# Altium footprint library Elements_LT.PcbLib: 145 footprints (part 2 of 10)
Each footprint in its own frame and in the unit in brackets; x right, y up, seen from the top. Pads: shape width x height; smd on the part's side, far side on the other; paste and mask are expansions set on the pad; w line width, h text height; cw(c..) or ccw(c..) is an arc to the next point about the centre after c.
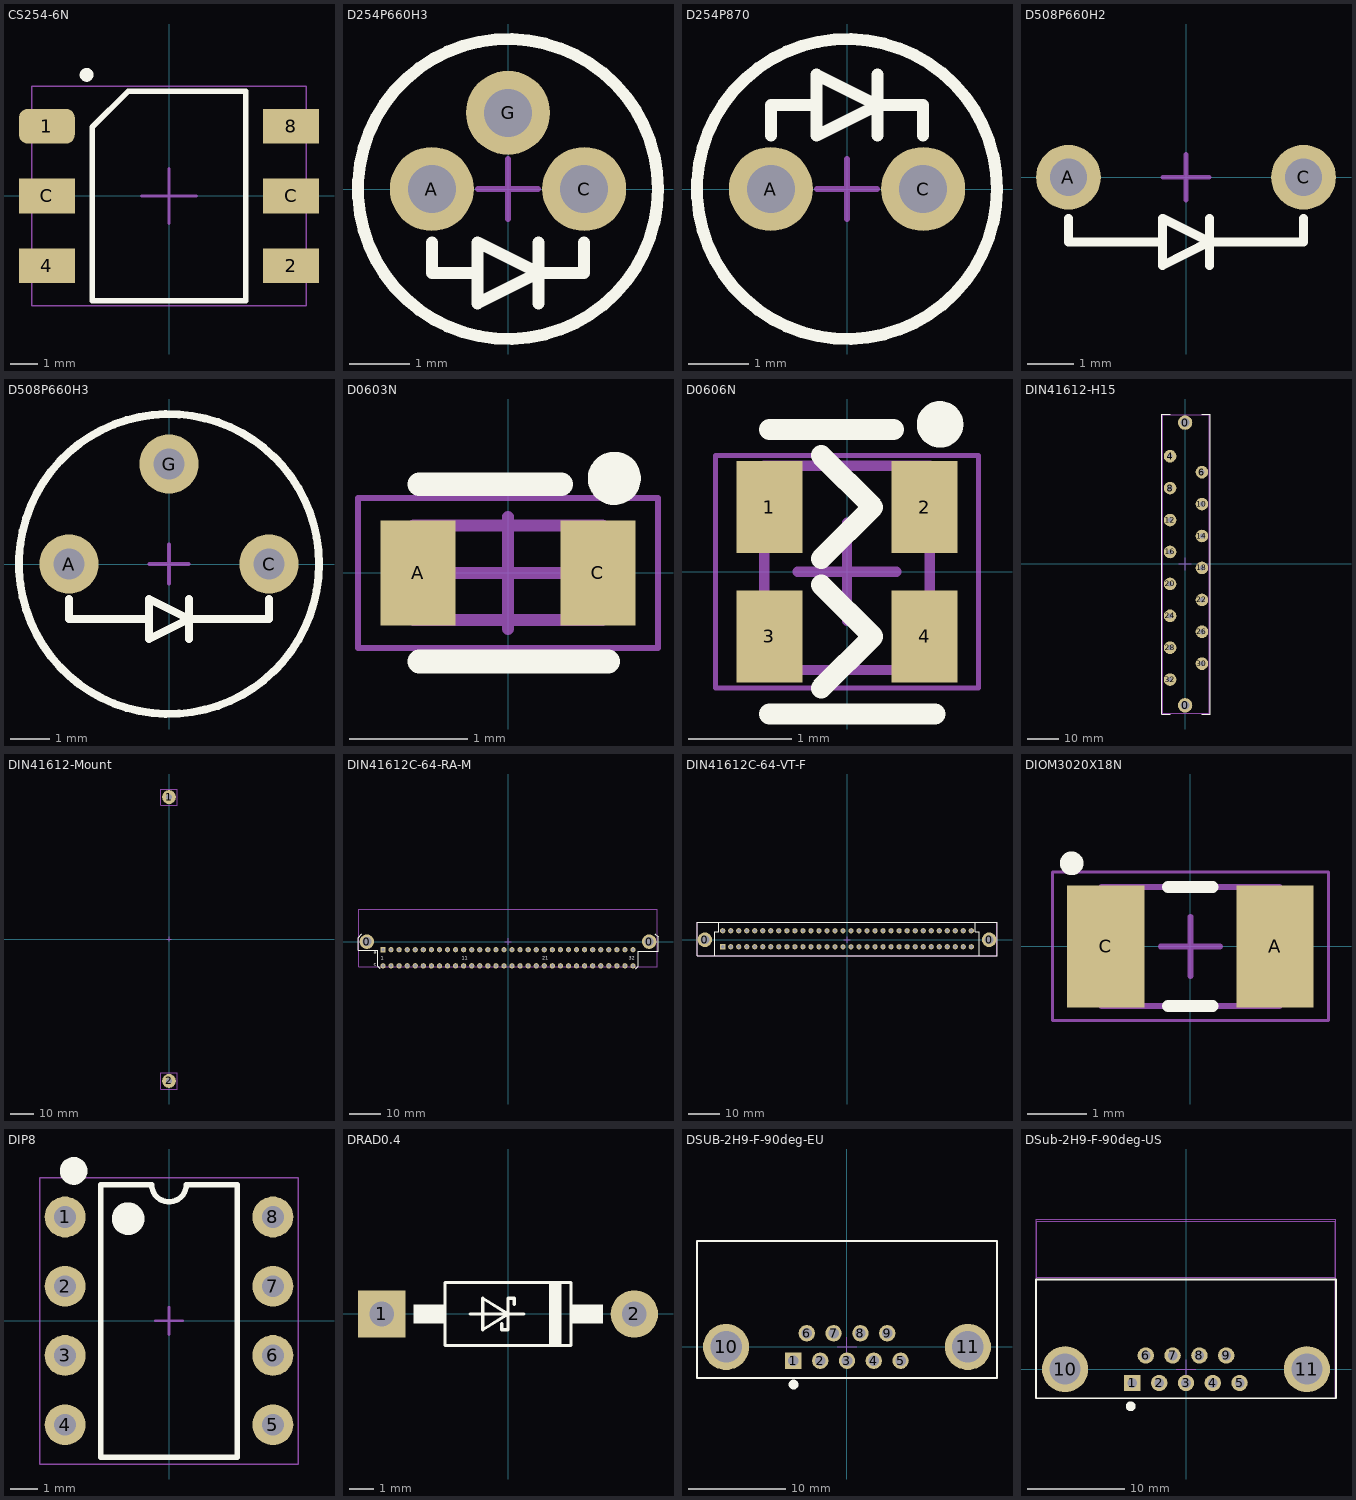
[diagram p1: the footprints below, top view; thin cyan lines are the x and y axes]

## CS254-6N [mil] "Code Switch, 4 Bits, 6 Pins, SMD"
pads (6):
  rrect50% 80x50 smd: 1(-175,100)
  rect 80x50 smd: 2(175,-100) 4(-175,-100) 8(175,100) C(-175,0) C(175,0)
Top Overlay:
  circle w11.81: c-118.11,173.54 r3.94
  lines w7.87: -110,-150 110,-150 110,150 -58.66,150 -110,98.66 -110,-150
Mechanical 15:
  lines w1.97: -196.85,-157.48 196.85,-157.48 196.85,157.48 -196.85,157.48 -196.85,-157.48
  lines w3.94: -39.37,0 39.37,0 ; 0,-39.37 0,39.37
3D body: height 169.29, standoff 0, extent -157.48,-157.48 157.48,157.48

## D254P660H3 [mm] "Diode, Single, 3 Pins, Pitch 2.54mm"
height 6.6
pads (3):
  round 1.4 hole 0.8: A(-1.27,0) C(1.27,0) G(0,1.27)
Top Overlay:
  circle w0.2: c0,0 r2.5
  lines w0.2: -1.27,-0.889 -1.27,-1.397 -0.508,-1.397 ; 0.508,-1.905 0.508,-0.889 ; 1.27,-0.889 1.27,-1.397 0.508,-1.397 ; 0.508,-1.397 -0.508,-1.905 -0.508,-0.889 0.508,-1.397
Top Solder:
  circle w0.305: c1.27,-1.27 r0.127
Mechanical 15:
  lines w0.1: -0.5,0 0.5,0 ; 0,-0.5 0,0.5

## D254P870 [mm] "Diode, Single, Pitch 2.54mm"
height 8.7
pads (2):
  round 1.4 hole 0.8: A(-1.27,0) C(1.27,0)
Top Overlay:
  circle w0.2: c0,0 r2.5
  lines w0.2: -1.27,0.889 -1.27,1.397 -0.508,1.397 ; 0.508,0.889 0.508,1.905 ; 1.27,0.889 1.27,1.397 0.508,1.397 ; 0.508,1.397 -0.508,0.889 -0.508,1.905 0.508,1.397
Top Solder:
  circle w0.305: c1.27,-1.27 r0.127
Mechanical 15:
  lines w0.1: -0.5,0 0.5,0 ; 0,-0.5 0,0.5

## D508P660H2 [mm] "Diode, Single, 2 Pins, Pitch 5.08mm"
height 6.6
pads (2):
  round 1.4 hole 0.8: A(-2.54,0) C(2.54,0)
Top Overlay:
  lines w0.2: -2.54,-0.889 -2.54,-1.397 -0.508,-1.397 ; 0.508,-1.905 0.508,-0.889 ; 2.54,-0.889 2.54,-1.397 0.508,-1.397 ; 0.508,-1.397 -0.508,-0.889 -0.508,-1.905 0.508,-1.397
Top Solder:
  circle w0.305: c2.54,1.27 r0.127
Mechanical 15:
  lines w0.1: -0.5,0 0.5,0 ; 0,-0.5 0,0.5

## D508P660H3 [mm] "Diode, Single, 3 Pins, Pitch 5.08mm"
height 6.6
pads (3):
  round 1.5 hole 0.8: A(-2.54,0) C(2.54,0) G(0,2.54)
Top Overlay:
  circle w0.2: c0,0 r3.81
  lines w0.2: -2.54,-0.889 -2.54,-1.397 -0.508,-1.397 ; 0.508,-1.905 0.508,-0.889 ; 2.54,-0.889 2.54,-1.397 0.508,-1.397 ; 0.508,-1.397 -0.508,-1.905 -0.508,-0.889 0.508,-1.397
Top Solder:
  circle w0.305: c2.54,1.27 r0.127
Mechanical 15:
  lines w0.1: -0.5,0 0.5,0 ; 0,-0.5 0,0.5

## D0603N [mil] "LED, SMD, 0603 / 1608"
height 39.37
pads (2):
  rect 25x35 smd: A(-30,0) C(30,0)
Top Overlay:
  circle w9.84: c35.43,31.5 r3.94
  lines w7.87: -29.53,-29.53 33.46,-29.53 ; -29.53,29.53 17.72,29.53
Mechanical 13:
  lines w3.94: -31.49,-15.75 -31.49,15.75 31.5,15.75 31.5,-15.75 -31.49,-15.75
Mechanical 15:
  lines w1.97: -50,-25 -50,25 50,25 50,-25 -50,-25
  lines w3.94: -18.7,0 18.7,0 ; 0,-18.7 0,18.7
3D body: height 29.53, standoff 7.87, extent -19.68,-15.75 19.69,15.75
3D body: height 7.87, standoff 0, extent -31.5,-15.75 31.5,15.75

## D0606N [mm] "LED, BiColor, SMD, 0606 / 1616"
height 1
pads (4):
  rect 0.635x0.889 smd: 1(-0.75,0.625) 2(0.75,0.625) 3(-0.75,-0.625) 4(0.75,-0.625)
Top Overlay:
  circle w0.25: c0.9,1.425 r0.1
  lines w0.2: -0.75,-1.375 0.85,-1.375 ; -0.75,1.375 0.45,1.375 ; -0.25,-1.125 0.25,-0.625 -0.25,-0.125 ; -0.25,0.125 0.25,0.625 -0.25,1.125
Mechanical 13:
  lines w0.1: -0.8,-0.95 0.8,-0.95 0.8,1.025 -0.8,1.025 -0.8,-0.95
Mechanical 15:
  lines w0.05: -1.27,-1.125 1.27,-1.125 1.27,1.125 -1.27,1.125 -1.27,-1.125
  lines w0.1: -0.475,0 0.475,0 ; 0,-0.475 0,0.475
3D body: height 0.2, standoff 0, extent -0.8,-1.025 0.8,1.025
3D body: height 0.75, standoff 0.2, extent -0.7,0 0.7,0.975
3D body: height 0.75, standoff 0.2, extent -0.7,-0.975 0.7,0

## DIN41612-H15 [mm] "DIN41612 Power Connector H15"
height 10
pads (17):
  round 4.6 hole 2.8: 0(0,-45) 0(0,45)
  round 4 hole 1.6: 4(-4.78,34.29) 6(5.38,29.21) 8(-4.78,24.13) 10(5.38,19.05) 12(-4.78,13.97) 14(5.38,8.89) 16(-4.78,3.81) 18(5.38,-1.27) 20(-4.78,-6.35) 22(5.38,-11.43) 24(-4.78,-16.51) 26(5.38,-21.59) 28(-4.78,-26.67) 30(5.38,-31.75) 32(-4.78,-36.83)
Top Overlay:
  lines w0.2: -4.7,-47.77 -7.45,-47.77 -7.45,47.73 -4.7,47.73 ; 5.3,-47.77 8.05,-47.77 8.05,47.73 5.3,47.73
Mechanical 13:
  lines w0.1: -7.1,-47.5 7.7,-47.5 7.7,47.5 -7.1,47.5 -7.1,-47.5
Mechanical 15:
  lines w0.05: -7.2,-47.52 7.8,-47.52 7.8,47.48 -7.2,47.48 -7.2,-47.52
  lines w0.1: -2,0 2,0 ; 0,-2 0,2
3D body "41612-h15.stp": height 10, standoff -4.3, extent -7.1,-47.5 7.7,47.5

## DIN41612-Mount [mm] "Back Plane Case Mounting Pad"
pads (2):
  round 6 hole 2.7: 1(0,61.25) 2(0,-61.25)
Mechanical 15:
  lines w0.05: -3.5,-64.75 -3.5,-57.75 3.5,-57.75 3.5,-64.75 -3.5,-64.75 ; -3.5,57.75 -3.5,64.75 3.5,64.75 3.5,57.75 -3.5,57.75
  lines w0.1: -1,0 1,0 ; 0,-1 0,1

## DIN41612C-64-RA-M [mm] "Connector; DIN 41612, Type C, Thru-Hole; Rows a+c, 64 Position; Right Angle"
height 11.1
pads (66):
  round 4.6 hole 2.8: 0(-44.45,0) 0(44.45,0)
  rect 1.65x1.65 hole 1: A1(-39.37,-2.54)
  round 1.65 hole 1: A2(-36.83,-2.54) A3(-34.29,-2.54) A4(-31.75,-2.54) A5(-29.21,-2.54) A6(-26.67,-2.54) A7(-24.13,-2.54) A8(-21.59,-2.54) A9(-19.05,-2.54) A10(-16.51,-2.54) A11(-13.97,-2.54) A12(-11.43,-2.54) A13(-8.89,-2.54) A14(-6.35,-2.54) A15(-3.81,-2.54) A16(-1.27,-2.54) A17(1.27,-2.54) A18(3.81,-2.54) A19(6.35,-2.54) A20(8.89,-2.54) A21(11.43,-2.54) A22(13.97,-2.54) A23(16.51,-2.54) A24(19.05,-2.54) A25(21.59,-2.54) A26(24.13,-2.54) A27(26.67,-2.54) A28(29.21,-2.54) A29(31.75,-2.54) A30(34.29,-2.54) A31(36.83,-2.54) A32(39.37,-2.54) C1(-39.37,-7.62) C2(-36.83,-7.62) C3(-34.29,-7.62) C4(-31.75,-7.62) C5(-29.21,-7.62) C6(-26.67,-7.62) C7(-24.13,-7.62) C8(-21.59,-7.62) C9(-19.05,-7.62) C10(-16.51,-7.62) C11(-13.97,-7.62) C12(-11.43,-7.62) C13(-8.89,-7.62) C14(-6.35,-7.62) C15(-3.81,-7.62) C16(-1.27,-7.62) C17(1.27,-7.62) C18(3.81,-7.62) C19(6.35,-7.62) C20(8.89,-7.62) C21(11.43,-7.62) C22(13.97,-7.62) C23(16.51,-7.62) C24(19.05,-7.62) C25(21.59,-7.62) C26(24.13,-7.62) C27(26.67,-7.62) C28(29.21,-7.62) C29(31.75,-7.62) C30(34.29,-7.62) C31(36.83,-7.62) C32(39.37,-7.62)
Top Overlay:
  lines w0.2: -46,2.5 -47.25,1.25 -47.25,-2.74 -42.125,-2.74 -41,-2.74 -41,-6.75 -41,-7.75 -40.375,-8.375 ; 40.25,-8.5 41,-7.75 41,-2.955 47.25,-2.955 47.25,1.5 46.25,2.5
  text "21" at 10.795,-6.13 h2
  text "11" at -14.605,-6.13 h2
  text "32" at 38.1,-6.13 h2
  text "c" at -42.25,-7.99 h2
  text "a" at -42.25,-4.24 h2
  text "1" at -40.005,-6.13 h2
Mechanical 13:
  lines w0.1: -47,10.16 47,10.16 47,-7.91 -47,-7.91 -47,10.16 ; -47,10.16 -47,10.16
Mechanical 15:
  lines w0.1: -1,0 1,0 ; 0,-1 0,1
3D body "41612-m-ra-ac.stp": height 9.4, standoff -2.82, extent -47,-7.91 47,10.16

## DIN41612C-64-VT-F [mm] "Connector; DIN 41612, Type C, Thru-Hole; Rows a+c, 64 Position; Vertical"
height 11.6
pads (66):
  round 4.6 hole 2.8: 0(-45,0) 0(45,0)
  rect 1.65x1.65 hole 1: A1(-39.37,-2.24)
  round 1.65 hole 1: A2(-36.83,-2.24) A3(-34.29,-2.24) A4(-31.75,-2.24) A5(-29.21,-2.24) A6(-26.67,-2.24) A7(-24.13,-2.24) A8(-21.59,-2.24) A9(-19.05,-2.24) A10(-16.51,-2.24) A11(-13.97,-2.24) A12(-11.43,-2.24) A13(-8.89,-2.24) A14(-6.35,-2.24) A15(-3.81,-2.24) A16(-1.27,-2.24) A17(1.27,-2.24) A18(3.81,-2.24) A19(6.35,-2.24) A20(8.89,-2.24) A21(11.43,-2.24) A22(13.97,-2.24) A23(16.51,-2.24) A24(19.05,-2.24) A25(21.59,-2.24) A26(24.13,-2.24) A27(26.67,-2.24) A28(29.21,-2.24) A29(31.75,-2.24) A30(34.29,-2.24) A31(36.83,-2.24) A32(39.37,-2.24) C1(-39.37,2.84) C2(-36.83,2.84) C3(-34.29,2.84) C4(-31.75,2.84) C5(-29.21,2.84) C6(-26.67,2.84) C7(-24.13,2.84) C8(-21.59,2.84) C9(-19.05,2.84) C10(-16.51,2.84) C11(-13.97,2.84) C12(-11.43,2.84) C13(-8.89,2.84) C14(-6.35,2.84) C15(-3.81,2.84) C16(-1.27,2.84) C17(1.27,2.84) C18(3.81,2.84) C19(6.35,2.84) C20(8.89,2.84) C21(11.43,2.84) C22(13.97,2.84) C23(16.51,2.84) C24(19.05,2.84) C25(21.59,2.84) C26(24.13,2.84) C27(26.67,2.84) C28(29.21,2.84) C29(31.75,2.84) C30(34.29,2.84) C31(36.83,2.84) C32(39.37,2.84)
Top Overlay:
  lines w0.2: -41.91,-4.993 -41.91,2.54 -40.64,2.54 -40.64,5.507 ; 40.64,5.507 40.64,2.54 41.91,2.54 41.91,-4.993 ; -47.5,-5.034 -47.5,-2.875 -47.5,5.507 47.5,5.507 47.5,-2.875 47.5,-5.034 -47.5,-5.034
Bottom Solder:
  text "c" at 42.037,2.159 h3
  text "a" at 42.037,-2.921 h3
  text "21" at 12.7,-5.715 h3
  text "11" at -12.7,-5.715 h3
  text "32" at 40.64,-5.715 h3
  text "1" at -38.735,-5.715 h3
Mechanical 13:
  lines w0.1: -47.5,-4.993 47.5,-4.993 47.5,5.507 -47.5,5.507 -47.5,-4.993
Mechanical 15:
  lines w0.05: -47.5,-4.993 47.5,-4.993 47.5,5.507 -47.5,5.507 -47.5,-4.993
  lines w0.1: -1,0 1,0 ; 0,-1 0,1
3D body "6921.stp": height 3.4, standoff -12.2, extent -47.5,-4.993 47.5,5.507

## DIOM3020X18N [mm] "Molded Diode, 2-Leads, Body 3,00x2,00mm, IPC Medium Density"
height 1.8
pads (2):
  rect 1.3x2.05 smd: A(1.425,0) C(-1.425,0)
Top Overlay:
  circle w0.2: c-2,1.4 r0.1
  lines w0.2: -0.375,-1 0.375,-1 ; -0.375,1 0.375,1
Top Solder:
  circle w0.2: c-2.5,1.4 r0.1
Mechanical 13:
  rectangle: -1.5,-1 -1.097,1
  lines w0.1: -1.5,-1 1.5,-1 1.5,1 -1.5,1 -1.5,-1
Mechanical 15:
  lines w0.05: -2.325,-1.25 2.325,-1.25 2.325,1.25 -2.325,1.25 -2.325,-1.25
  lines w0.1: -0.5,0 0.5,0 ; 0,-0.5 0,0.5
3D body: height 1.1, standoff 0, extent -1.5,-1 1.5,1

## DIP8 [mil] "DIP package, 8 Pins, Pitch 2.54mm"
height 200
pads (8):
  round 59 hole 31.5: 1(-150,150) 2(-150,50) 3(-150,-50) 4(-150,-150) 5(150,-150) 6(150,-50) 7(150,50) 8(150,150)
Top Overlay:
  circle w23.62: c-59.06,147.64 r11.81
  circle w20: c-137.8,216.54 r10
  lines w7.87: -98.43,-196.85 98.43,-196.85 98.43,196.85 25,196.85 cw(c0,196.85) -25,196.85 -98.43,196.85 -98.43,-196.85
Mechanical 15:
  lines w1.97: -187.01,-206.69 -187.01,206.69 187.01,206.69 187.01,-206.69 -187.01,-206.69
  lines w3.94: -19.68,0 19.68,0 ; 0,-19.68 0,19.68
3D body "P0008A.stp": height 165.72, standoff -132.54, extent -161.49,-182.5 161.49,182.5

## DRAD0.4 [mm] "Diode, THT, Pitch 400mil"
pads (2):
  rect 1.905x1.905 hole 1: 1(-5.08,0)
  round 1.905 hole 1: 2(5.08,0)
Top Overlay:
  region: -2.54,0.383 -3.81,0.383 -3.81,-0.379 -2.54,-0.379
  region: 3.812,0.381 2.542,0.381 2.542,-0.381 3.812,-0.381
  region: 2.159,1.268 1.651,1.268 1.651,-1.272 2.159,-1.272
  lines w0.127: -1.524,0 0,0 ; -0.254,-0.381 -0.254,-0.635 0,-0.635 0,0 ; 0.254,0.381 0.254,0.635 0,0.635 0,0 ; 0.635,0 0,0 ; 0,0 -1.016,-0.635 -1.016,0.635 0,0 ; -2.54,-1.27 2.54,-1.27 2.54,1.27 -2.54,1.27 -2.54,-1.27
3D body "User Library-DO-41-2.STEP": height 2.72, standoff -2.6, extent -5.512,-1.36 5.512,1.36

## DSUB-2H9-F-90deg-EU [mm] "Connector; D Subminiature; 9 Position; Right Angle; Pitch 1.385 mm; Female; EU"
height 12.75
pads (11):
  rect 1.69x1.69 hole 1.09: 1(-5.54,-1.42)
  round 1.69 hole 1.09: 2(-2.77,-1.42) 3(0,-1.42) 4(2.77,-1.42) 5(5.54,-1.42) 6(-4.155,1.42) 7(-1.385,1.42) 8(1.385,1.42) 9(4.155,1.42)
  round 4.76 hole 3.26: 10(-12.495,0) 11(12.495,0)
Top Overlay:
  circle w0.508: c-5.525,-3.885 r0.254
  lines w0.2: -15.5,-3.2 -15.5,10.95 15.5,10.95 15.5,-3.2 -15.5,-3.2
Mechanical 15:
  lines w0.1: -1,0 1,0 ; 0,-1 0,1
3D body "anschluss_a-df_09_a_kg-t1.stp": height 12.56, standoff -4.31, extent -15.405,-3.1 15.405,17.7

## DSub-2H9-F-90deg-US [mm] "Connector; D Subminiature; 9 Position; Right Angle; Pitch 1.385 mm; Female; US"
height 12.75
pads (11):
  rect 1.69x1.69 hole 1: 1(-5.54,-1.42)
  round 1.69 hole 1: 2(-2.77,-1.42) 3(0,-1.42) 4(2.77,-1.42) 5(5.54,-1.42) 6(-4.155,1.42) 7(-1.385,1.42) 8(1.385,1.42) 9(4.155,1.42)
  round 4.76 hole 3.2: 10(-12.495,0) 11(12.495,0)
Top Overlay:
  circle w0.508: c-5.715,-3.835 r0.254
  lines w0.2: -15.5,-3 -15.5,9.25 15.5,9.25 15.5,-3 -15.5,-3
Mechanical 13:
  lines w0.05: -15.405,-3 15.405,-3 15.405,15.3 -15.405,15.3 -15.405,-3
  lines w0.1: -15.405,9.5 15.405,9.5
Mechanical 15:
  lines w0.05: -15.5,-3 15.5,-3 15.5,15.5 -15.5,15.5 -15.5,-3
  lines w0.1: -1,0 1,0 ; 0,-1 0,1
3D body "anschluss_a-df_09_a_kg-t2.stp": height 12.56, standoff -4.31, extent -15.405,-3 15.405,15.3